# Altium integrated library Design III Symbols.IntLib: 69 symbols
Pins are listed as number, name and electrical type; pins without a type are passive.

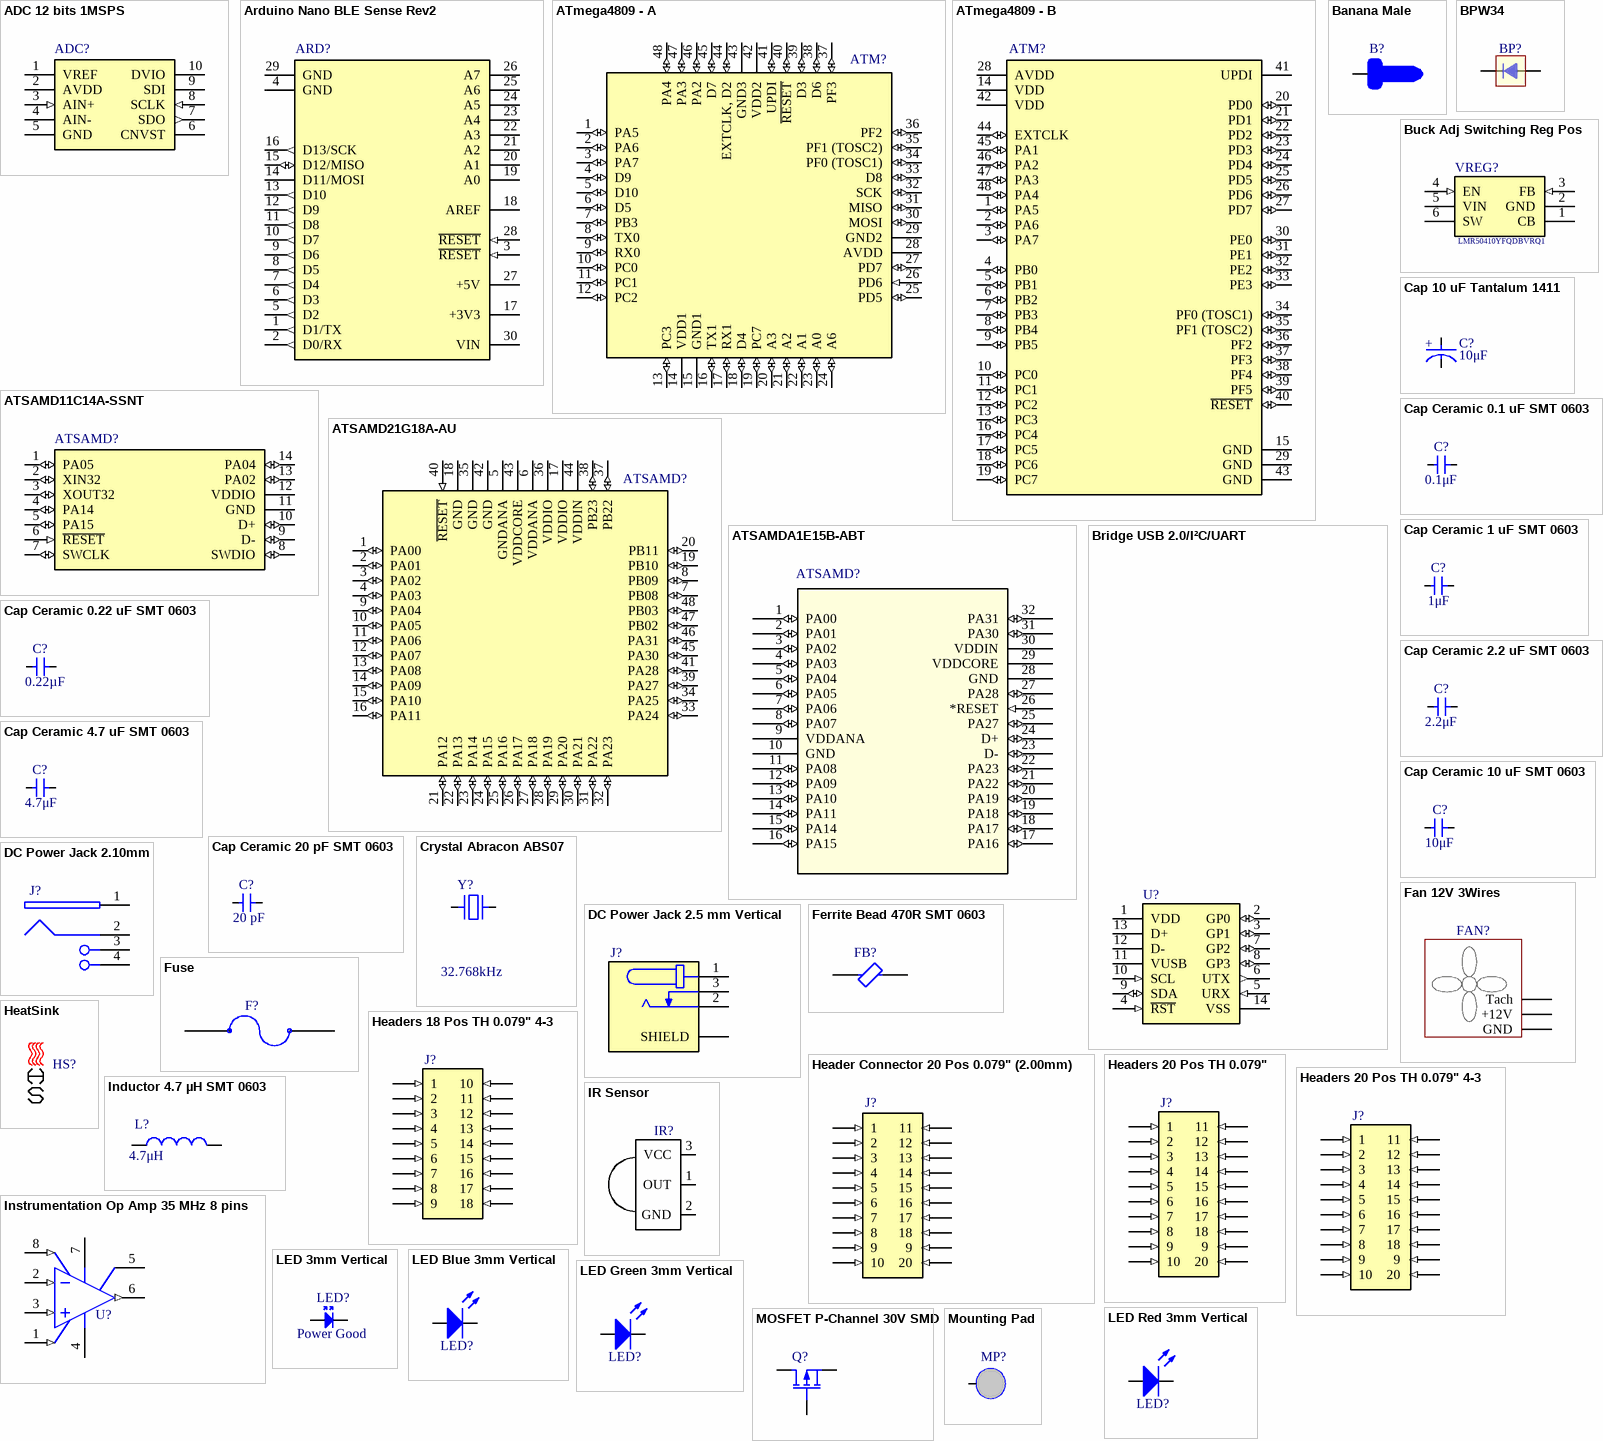
[diagram p0: symbols ADC 12 bits 1MSPS to Mounting Pad]

## ADC 12 bits 1MSPS
designator ADC?, comment MCP33141-10-E/MS  (value not drawn)
12 Bit Analog to Digital Converter 1 Input 1 SAR 10-MSOP; Supplier 1: Digi-Key; Supplier Part Number 1: MCP33141-10-E/MS-ND
footprint MCP33141-10-E/MS (12 Bit Analog to Digital Converter 1 Input 1 SAR 10-MSOP)
pins: 1 VREF (power), 2 AVDD (power), 3 AIN+ (in), 4 AIN-, 5 GND (power), 6 CNVST, 7 SDO (out), 8 SCLK (in), 9 SDI, 10 DVIO (power)

## Arduino Nano BLE Sense Rev2
designator ARD?
ABX00069, nRF52840 64MHz, 256 KB SRAM, 1MB flash, 14 I/O pins, 8 Analog inputs; Supplier 1: Digi-Key; Supplier Part Number 1: 1050-ABX00069-ND; ComponentLink1Description: Datasheet; ComponentLink1URL: https://docs.arduino.cc/static/65becb67a4b40fb616bb6af2730da4c7/ABX00069-datasheet.pdf; ComponentLink2Description: Pinout; ComponentLink2URL: https://docs.arduino.cc/static/9954a74bd83e85753daa710cb3e36c7d/ABX00069-full-pinout.pdf; ComponentLink3Description: Schematics; ComponentLink3URL: https://docs.arduino.cc/static/e36f3575dfede10661305c9971c3e7ed/ABX00069-schematics.pdf
footprint Arduino Nano BLE Sense Rev2 A (ABX00069, nRF52840 64MHz, 256 KB SRAM, 1MB flash, 14 I/O pins, 8 Analog inputs)
footprint Arduino Nano BLE Sense Rev2 B (ABX00069, nRF52840 64MHz, 256 KB SRAM, 1MB flash, 14 I/O pins, 8 Analog inputs)
pins: 1 D1/TX (out), 2 D0/RX (out), 3 ~{RESET} (in), 4 GND (power), 5 D2 (out), 6 D3 (out), 7 D4 (out), 8 D5 (out), 9 D6 (out), 10 D7 (out), 11 D8 (out), 12 D9 (out), 13 D10 (out), 14 D11/MOSI (hiz), 15 D12/MISO (io), 16 D13/SCK (out), 17 +3V3 (power), 18 AREF, 19 A0 (hiz), 20 A1 (hiz), 21 A2 (hiz), 22 A3 (hiz), 23 A4 (hiz), 24 A5 (hiz), 25 A6 (hiz), 26 A7 (hiz), 27 +5V (power), 28 ~{RESET} (in), 29 GND (power), 30 VIN (power)

## ATmega4809 - A
designator ATM?, comment ATMEGA4809-AU  (value not drawn)
AVR megaAVR® 0, Functional Safety (FuSa) Microcontroller IC 8-Bit 20MHz 48KB (24K x 16) FLASH 48-TQFP (7x7); Manufacturer_Name: Microchip; Manufacturer_Part_Number: ATMEGA4809-AFR; Geometry.Height: 1.2mm; Mouser Part Number: 556-ATMEGA4809-AFR; Mouser Price/Stock: https://www.mouser.co.uk/ProductDetail/Microchip-Technology-Atmel/ATMEGA4809-AFR?qs=lYGu3FyN48fyX8GjkvcD6Q%3D%3D; Arrow Part Number: ATMEGA4809-AFR; Arrow Price/Stock: https://www.arrow.com/en/products/atmega4809-afr/microchip-technology?region=nac; Datasheet Link: https://datasheet.datasheetarchive.com/originals/distributors/DKDS41/DSANUWW0026740.pdf; Supplier 1: Digi-Key; Supplier Part Number 1: ATMEGA4809-AFRCT-ND; Supplier 2: Digi-Key; Supplier Part Number 2: ATMEGA4809-AFRDKR-ND
footprint ATmega4809 (AVR megaAVR® 0, Functional Safety (FuSa) Microcontroller IC 8-Bit 20MHz 48KB (24K x 16) FLASH 48-TQFP (7x7))
pins: 1 PA5 (io), 2 PA6 (io), 3 PA7 (io), 4 D9 (io), 5 D10 (io), 6 D5 (io), 7 PB3 (io), 8 TX0 (io), 9 RX0 (io), 10 PC0 (io), 11 PC1 (io), 12 PC2 (io), 13 PC3 (io), 14 VDD1 (power), 15 GND1 (power), 16 TX1 (io), 17 RX1 (io), 18 D4 (io), 19 PC7 (io), 20 A3 (io), 21 A2 (io), 22 A1 (io), 23 A0 (io), 24 A6 (io), 25 PD5 (io), 26 PD6 (in), 27 PD7 (io), 28 AVDD (power), 29 GND2 (power), 30 MOSI (io), 31 MISO (io), 32 SCK (io), 33 D8 (io), 34 PF0 (TOSC1) (io), 35 PF1 (TOSC2) (io), 36 PF2 (io), 37 PF3 (io), 38 D6 (io), 39 D3 (io), 40 ~{RESET} (io), 41 UPDI (io), 42 VDD2 (power), 43 GND3 (power), 44 EXTCLK, D2 (io), 45 D7 (io), 46 PA2 (io), 47 PA3 (io), 48 PA4 (io)

## ATmega4809 - B
designator ATM?, comment ATMEGA4809-AU  (value not drawn)
MICROCHIP - ATMEGA4809-AFR - MCU, 8BIT, ATMEGA, 20MHZ, TQFP-48; Supplier 1: Digi-Key; Supplier Part Number 1: 150-ATMEGA4809-AU-ND; Supplier 2: Digi-Key; Supplier Part Number 2: 150-ATMEGA4809-AURCT-ND; Supplier 3: Digi-Key; Supplier Part Number 3: 150-ATMEGA4809-AURDKR-ND; Supplier 4: Digi-Key; Supplier Part Number 4: 150-ATMEGA4809-AURTR-ND
footprint ATmega4809 (AVR megaAVR® 0, Functional Safety (FuSa) Microcontroller IC 8-Bit 20MHz 48KB (24K x 16) FLASH 48-TQFP (7x7))
pins: 1 PA5 (io), 2 PA6 (io), 3 PA7 (io), 4 PB0 (io), 5 PB1 (io), 6 PB2 (io), 7 PB3 (io), 8 PB4 (io), 9 PB5 (io), 10 PC0 (io), 11 PC1 (io), 12 PC2 (io), 13 PC3 (io), 14 VDD (power), 15 GND (oe), 16 PC4 (io), 17 PC5 (io), 18 PC6 (io), 19 PC7 (io), 20 PD0 (io), 21 PD1 (io), 22 PD2 (io), 23 PD3 (io), 24 PD4 (io), 25 PD5 (io), 26 PD6 (io), 27 PD7 (io), 28 AVDD (power), 29 GND (power), 30 PE0 (io), 31 PE1 (io), 32 PE2 (io), 33 PE3 (io), 34 PF0 (TOSC1) (io), 35 PF1 (TOSC2) (io), 36 PF2 (io), 37 PF3 (io), 38 PF4 (io), 39 PF5 (io), 40 ~{RESET} (io), 41 UPDI, 42 VDD (power), 43 GND (power), 44 EXTCLK (io), 45 PA1 (io), 46 PA2 (io), 47 PA3 (io), 48 PA4 (io)

## ATSAMD11C14A-SSNT
designator ATSAMD?
ARM® Cortex®-M0+ SAM D11C Microcontroller IC 32-Bit Single-Core 48MHz 16KB (16K x 8) FLASH 14-SOIC; Supplier 1: Digi-Key; Supplier Part Number 1: ATSAMD11C14A-SSNTCT-ND; Supplier 2: Digi-Key; Supplier Part Number 2: ATSAMD11C14A-SSNTDKR-ND
footprint ATSAMD11C14A-SSNT (ARM® Cortex®-M0+ SAM D11C Microcontroller IC 32-Bit Single-Core 48MHz 16KB (16K x 8) FLASH 14-SOIC)
pins: 1 PA05 (io), 2 XIN32 (io), 3 XOUT32 (io), 4 PA14 (io), 5 PA15 (io), 6 ~{RESET} (in), 7 SWCLK (io), 8 SWDIO (io), 9 D- (io), 10 D+ (io), 11 GND (power), 12 VDDIO (power), 13 PA02 (io), 14 PA04 (io)

## ATSAMD21G18A-AU
designator ATSAMD?
ARM® Cortex®-M0+ SAM D21G, Functional Safety (FuSa) Microcontroller IC 32-Bit Single-Core 48MHz 256KB (256K x 8) FLASH 48-TQFP (7x7); Supplier 1: Digi-Key; Supplier Part Number 1: ATSAMD21G18A-AU-ND; ComponentLink1Description: Datasheet; ComponentLink1URL: https://ww1.microchip.com/downloads/en/DeviceDoc/SAM-D21-DA1-Family-Data-Sheet-DS40001882H.pdf; ComponentLink2Description: Arduino Zero; ComponentLink2URL: https://docs.arduino.cc/hardware/zero
footprint ATSAMD21G18-AU (ARM® Cortex®-M0+ SAM D21G, Functional Safety (FuSa) Microcontroller IC 32-Bit Single-Core 48MHz 256KB (256K x 8) FLASH 48-TQFP (7x7))
pins: 1 PA00 (io), 2 PA01 (io), 3 PA02 (io), 4 PA03 (io), 5 GNDANA (power) "Ground for the analog power domain", 6 VDDANA (power) "Analog supply voltage", 7 PB08 (io), 8 PB09 (io), 9 PA04 (io), 10 PA05 (io), 11 PA06 (io), 12 PA07 (io), 13 PA08 (io), 14 PA09 (io), 15 PA10 (io), 16 PA11 (io), 17 VDDIO (power) "Digital supply voltage", 18 GND (power) "Ground", 19 PB10 (io), 20 PB11 (io), 21 PA12 (io), 22 PA13 (io), 23 PA14 (io), 24 PA15 (io), 25 PA16 (io), 26 PA17 (io), 27 PA18 (io), 28 PA19 (io), 29 PA20 (io), 30 PA21 (io), 31 PA22 (io), 32 PA23 (io), 33 PA24 (io), 34 PA25 (io), 35 GND (power) "Ground", 36 VDDIO (power) "Digital supply voltage", 37 PB22 (io), 38 PB23 (io), 39 PA27 (io), 40 ~{RESET} (in) "Reset pin", 41 PA28 (io), 42 GND (power) "Ground", 43 VDDCORE (power) "Core supply voltage / external decoupling pin", 44 VDDIN (power), 45 PA30 (io), 46 PA31 (io), 47 PB02 (io), 48 PB03 (io)

## ATSAMDA1E15B-ABT
designator ATSAMD?
ARM® Cortex®-M0+ SAM DA1, Functional Safety (FuSa) Microcontroller IC 32-Bit Single-Core 48MHz 32KB (32K x 8) FLASH 32-TQFP (7x7); Supplier 1: Digi-Key; Supplier Part Number 1: ATSAMDA1E15B-ABTCT-ND; Supplier 2: Digi-Key; Supplier Part Number 2: ATSAMDA1E15B-ABTDKR-ND
footprint ATSAMDA1E15B-ABT
pins: 1 PA00 (io), 2 PA01 (io), 3 PA02 (io), 4 PA03 (io), 5 PA04 (io), 6 PA05 (io), 7 PA06 (io), 8 PA07 (io), 9 VDDANA (power), 10 GND (power), 11 PA08 (io), 12 PA09 (io), 13 PA10 (io), 14 PA11 (io), 15 PA14 (io), 16 PA15 (io), 17 PA16 (io), 18 PA17 (io), 19 PA18 (io), 20 PA19 (io), 21 PA22 (io), 22 PA23 (io), 23 D- (io), 24 D+ (io), 25 PA27 (io), 26 *RESET (in), 27 PA28 (io), 28 GND (power), 29 VDDCORE (power), 30 VDDIN (power), 31 PA30 (io), 32 PA31 (io)

## Banana Male
designator B?
footprint Banane Male (Johnson 108-0753-001)
pins: 1

## BPW34
designator BP?
Photodiode
footprint BPW34 (BPW34 Trough Hole)
pins: 1, 2

## Bridge USB 2.0/I²C/UART
designator U?, comment MCP2221A-I/SL  (value not drawn)
USB Bridge, USB to I²C/UART USB 2.0 I²C, UART Interface 14-SOIC; USB Standard: USB 2.0; Max Supply Voltage: 5.5V; Supplier 1: Digi-Key; Supplier Part Number 1: MCP2221A-I/SL-ND
footprint MCP2221A-I/SL (USB Bridge, USB to I²C/UART USB 2.0 I²C, UART Interface 14-SOIC)
pins: 1 VDD (power), 2 GP0 (io), 3 GP1 (io), 4 ~{RST} (in), 5 URX (in), 6 UTX (out), 7 GP2 (io), 8 GP3 (io), 9 SDA (io), 10 SCL (in), 11 VUSB (power), 12 D- (power), 13 D+ (power), 14 VSS (power)
text: /

## Buck Adj Switching Reg Pos
designator VREG?, comment LMR50410YFQDBVRQ1
Buck Switching Regulator IC Positive Adjustable 1V 1 Output 1A SOT-23-6; Manufacturer_Name: Texas Instruments; Datasheet Link: https://www.ti.com/product/LMR50410-Q1; Height: 1.45mm; Manufacturer_Part_Number: LMR50410YFQDBVRQ1; Mouser Part Number: 595-MR50410YFQDBVRQ1; Mouser Price/Stock: https://www.mouser.co.uk/ProductDetail/Texas-Instruments/LMR50410YFQDBVRQ1?qs=81r%252BiQLm7BRUAgUFqYZycA%3D%3D; Arrow Part Number: LMR50410YFQDBVRQ1; Arrow Price/Stock: https://www.arrow.com/en/products/lmr50410yfqdbvrq1/texas-instruments?region=nac; Supplier 1: Digi-Key; Supplier Part Number 1: 296-LMR50410YFQDBVRQ1CT-ND; Supplier 2: Digi-Key; Supplier Part Number 2: 296-LMR50410YFQDBVRQ1DKR-ND; Supplier 3: Digi-Key; Supplier Part Number 3: 296-LMR50410YFQDBVRQ1TR-ND
footprint LMR50410YFQDBVRQ1 (Buck Switching Regulator IC Positive Adjustable 1V 1 Output 1A SOT-23-6)
pins: 1 CB (power), 2 GND (power), 3 FB (in), 4 EN (in), 5 VIN (power), 6 SW (power)

## Cap 10 uF Tantalum 1411
designator C?, comment value 10μF  (hidden comment: 293D106X9016B2TE3)
10 µF Molded Tantalum Capacitors 16 V 1411 (3528 Metric) 2Ohm; Voltage Rating: 16V; Case Code (Imperial): 1411; Supplier 1: Digi-Key; Supplier Part Number 1: 718-1124-1-ND; Supplier 2: Digi-Key; Supplier Part Number 2: 718-1124-6-ND; Supplier 3: Digi-Key; Supplier Part Number 3: 718-1124-2-ND
footprint Cap Tantalum 10 uF 16V SMT 1411 (10 µF Molded Tantalum Capacitors 16 V 1411 (3528 Metric) 2Ohm)
pins: 1 C, 2 A
text: +

## Cap Ceramic 0.1 uF SMT 0603
designator C?, comment Capacitance: 0.1μF  (hidden comment: CC0603JRX7R9BB104)
0.1 µF ±5% 50V Ceramic Capacitor X7R 0603 (1608 Metric); manufacturer: Yageo; Part Number: CC0603JRX7R9BB104; Applications: General Purpose; componentlink1description: Datasheet; componentlink1url: https://www.yageo.com/upload/media/product/productsearch/datasheet/mlcc/UPY-GPHC_X7R_6.3V-to-50V_18.pdf; componentlink2description: DigiKey Link; componentlink2url: https://www.digikey.com/en/products/detail/yageo/CC0603JRX7R9BB104/5195188; Device Package: 0603 (1608 Metric); lastupdated: 2023-03-06 20:08:09; Lifecycle Status: Active; Minimum Order: 1; Mounting Type: Surface Mount, MLCC; Operating Temperature: -55°C ~ 125°C; Package / Case: 0603 (1608 Metric); packaging: TapeAndReel; partid: 12474; Part Status: Active; price: 0.01; series: CC; Size / Dimension: 0.063" L x 0.031" W (1.60mm x 0.80mm); Temperature Coefficient: X7R; Thickness (Max): 0.035" (0.90mm); Tolerance: ±5%; Voltage - Rated: 50V; Supplier 1: Digi-Key; Supplier Part Number 1: 311-1779-1-ND; Supplier 2: Digi-Key; Supplier Part Number 2: 311-1779-6-ND; Supplier 3: Digi-Key; Supplier Part Number 3: 311-1779-2-ND
footprint Cap Ceramic 0.1 uF 50V SMT 0603 (0.1 µF ±5% 50V Ceramic Capacitor X7R 0603 (1608 Metric))
pins: 1, 2

## Cap Ceramic 0.22 uF SMT 0603
designator C?, comment Capacitance: 0.22µF  (hidden comment: GRM188R71E224KA88D)
0.22 µF ±10% 25V Ceramic Capacitor X7R 0603 (1608 Metric); manufacturer: Murata Electronics; Part Number: GRM188R71E224KA88D; Applications: General Purpose; componentlink1description: Datasheet; componentlink1url: https://www.murata.com/~/media/webrenewal/support/library/catalog/products/capacitor/mlcc/c02e.ashx?la=en-us; componentlink2description: DigiKey Link; componentlink2url: https://www.digikey.com/en/products/detail/murata-electronics/GRM188R71E224KA88D/702554; Device Package: 0603 (1608 Metric); lastupdated: 2023-03-05 20:08:17; Lifecycle Status: Active; Minimum Order: 1; Mounting Type: Surface Mount, MLCC; Operating Temperature: -55°C ~ 125°C; Package / Case: 0603 (1608 Metric); packaging: TapeAndReel; partid: 11196; Part Status: Active; price: 0.01; series: GRM; Size / Dimension: 0.063" L x 0.031" W (1.60mm x 0.80mm); Temperature Coefficient: X7R; Thickness (Max): 0.035" (0.90mm); Tolerance: ±10%; Voltage - Rated: 25V; Supplier 1: Digi-Key; Supplier Part Number 1: 490-3290-1-ND; Supplier 2: Digi-Key; Supplier Part Number 2: 490-3290-6-ND; Supplier 3: Digi-Key; Supplier Part Number 3: 490-3290-2-ND
footprint Cap Ceramic 0.22 uF 25V SMT 0603 (0.22 µF ±10% 25V Ceramic Capacitor X7R 0603 (1608 Metric))
pins: 1, 2

## Cap Ceramic 1 uF SMT 0603
designator C?, comment value 1μF  (hidden comment: CC0603KPX7R7BB105)
1 µF ±10% 16V Ceramic Capacitor X7R 0603 (1608 Metric); Dielectric: XR7; Tolerance: 10%; Max Operating Temperature: 125°C; Case Code (Imperial): 0603; Voltage Rating (DC): 16V; Resistor Type: Ceramic; Height: 0.8mm; Length: 1.6mm; Construction: Flat; Termination: SMT/SMD; Min Operating Temperature: -55°C; Supplier 1: Digi-Key; Supplier Part Number 1: 13-CC0603KPX7R7BB105CT-ND; Supplier 2: Digi-Key; Supplier Part Number 2: 13-CC0603KPX7R7BB105DKR-ND; Supplier 3: Digi-Key; Supplier Part Number 3: 13-CC0603KPX7R7BB105TR-ND
footprint Cap Ceramic 1 uF 16V SMT 0603 (1 µF ±10% 16V Ceramic Capacitor X5R 0603 (1608 Metric))
pins: 1, 2

## Cap Ceramic 2.2 uF SMT 0603
designator C?, comment value 2.2μF  (hidden comment: CC0603KRX7R5BB225)
2.2 µF ±10% 6.3V Ceramic Capacitor X7R 0603 (1608 Metric); manufacturer: Yageo; Part Number: CC0603KRX7R5BB225; Applications: General Purpose; componentlink1description: Datasheet; componentlink1url: https://www.yageo.com/upload/media/product/productsearch/datasheet/mlcc/UPY-GPHC_X7R_6.3V-to-50V_18.pdf; componentlink2description: DigiKey Link; componentlink2url: https://www.digikey.com/en/products/detail/yageo/CC0603KRX7R5BB225/5195203; Device Package: 0603 (1608 Metric); lastupdated: 2023-03-06 20:08:32; Lifecycle Status: Active; Minimum Order: 1; Mounting Type: Surface Mount, MLCC; Operating Temperature: -55°C ~ 125°C; Package / Case: 0603 (1608 Metric); packaging: TapeAndReel; partid: 41539; Part Status: Active; price: 0.01; series: CC; Size / Dimension: 0.063" L x 0.031" W (1.60mm x 0.80mm); Temperature Coefficient: X7R; Thickness (Max): 0.035" (0.90mm); Tolerance: ±10%; Voltage - Rated: 6.3V; ComponentLink1Description: Datasheet; ComponentLink1URL: *; Supplier 1: Digi-Key; Supplier Part Number 1: 311-1795-1-ND; Supplier 2: Digi-Key; Supplier Part Number 2: 311-1795-6-ND; Supplier 3: Digi-Key; Supplier Part Number 3: 311-1795-2-ND
footprint Cap Ceramic 2.2 uF 6.3V SMT 0603 (2.2 µF ±10% 6.3V Ceramic Capacitor X7R 0603 (1608 Metric))
pins: 1, 2

## Cap Ceramic 4.7 uF SMT 0603
designator C?, comment Capacitance: 4.7μF  (hidden comment: CC0603KRX5R7BB475)
4.7 µF ±10% 16V Ceramic Capacitor X5R 0603 (1608 Metric); manufacturer: Yageo; Part Number: CC0603KRX5R7BB475; Applications: General Purpose; componentlink1description: Datasheet; componentlink1url: https://www.yageo.com/upload/media/product/productsearch/datasheet/mlcc/UPY-GPHC_X5R_4V-to-50V_25.pdf; componentlink2description: DigiKey Link; componentlink2url: https://www.digikey.com/en/products/detail/yageo/CC0603KRX5R7BB475/5195193; Device Package: 0603 (1608 Metric); lastupdated: 2023-03-06 20:07:35; Lifecycle Status: Active; Minimum Order: 1; Mounting Type: Surface Mount, MLCC; Operating Temperature: -55°C ~ 85°C; Package / Case: 0603 (1608 Metric); packaging: TapeAndReel; partid: 46011; Part Status: Active; price: 0.02; series: CC; Size / Dimension: 0.063" L x 0.031" W (1.60mm x 0.80mm); Temperature Coefficient: X5R; Thickness (Max): 0.037" (0.95mm); Tolerance: ±10%; Voltage - Rated: 16V; Supplier 1: Digi-Key; Supplier Part Number 1: 311-1785-1-ND; Supplier 2: Digi-Key; Supplier Part Number 2: 311-1785-6-ND; Supplier 3: Digi-Key; Supplier Part Number 3: 311-1785-2-ND
footprint Cap Ceramic 4.7 uF SMT 0603 (4.7 µF ±10% 16V Ceramic Capacitor X5R 0603 (1608 Metric))
pins: 1, 2

## Cap Ceramic 10 uF SMT 0603
designator C?, comment Capacitance: 10μF  (hidden comment: GRM188R60J106KE47J)
10 µF ±10% 6.3V Ceramic Capacitor X5R 0603 (1608 Metric); manufacturer: Murata Electronics; Part Number: GRM188R60J106KE47J; Applications: General Purpose; componentlink2description: DigiKey Link; componentlink2url: https://www.digikey.com/en/products/detail/murata-electronics/GRM188R60J106KE47J/10691412; Device Package: 0603 (1608 Metric); lastupdated: 2023-03-08 20:07:22; Lifecycle Status: Active; Minimum Order: 1; Mounting Type: Surface Mount, MLCC; Operating Temperature: -55°C ~ 85°C; Package / Case: 0603 (1608 Metric); packaging: TapeAndReel; partid: 47219; Part Status: Active; price: 0.01; series: GRM; Size / Dimension: 0.063" L x 0.032" W (1.60mm x 0.80mm); Temperature Coefficient: X5R; Thickness (Max): 0.035" (0.90mm); Tolerance: ±10%; Voltage - Rated: 6.3V; Supplier 1: Digi-Key; Supplier Part Number 1: 490-GRM188R60J106KE47JCT-ND; Supplier 2: Digi-Key; Supplier Part Number 2: 490-GRM188R60J106KE47JDKR-ND; Supplier 3: Digi-Key; Supplier Part Number 3: 490-GRM188R60J106KE47JTR-ND
footprint Cap Ceramic 10 uF SMT 0603 (10 µF ±10% 6.3V Ceramic Capacitor X5R 0603 (1608 Metric))
pins: 1, 2

## Cap Ceramic 20 pF SMT 0603
designator C?, comment Capacitance: 20 pF  (hidden comment: CC0603JRNPO9BN200)
20 pF ±5% 50V Ceramic Capacitor C0G, NP0 0603 (1608 Metric); manufacturer: Yageo; Part Number: CC0603JRNPO9BN200; Applications: General Purpose; componentlink1description: Datasheet; componentlink1url: https://www.yageo.com/upload/media/product/productsearch/datasheet/mlcc/UPY-GP_NP0_16V-to-50V_17.pdf; componentlink2description: DigiKey Link; componentlink2url: https://www.digikey.com/en/products/detail/yageo/CC0603JRNPO9BN200/2833589; Device Package: 0603 (1608 Metric); lastupdated: 2023-03-06 20:07:50; Lifecycle Status: Active; Minimum Order: 1; Mounting Type: Surface Mount, MLCC; Operating Temperature: -55°C ~ 125°C; Package / Case: 0603 (1608 Metric); packaging: TapeAndReel; partid: 16728; Part Status: Active; price: 0.01; series: CC; Size / Dimension: 0.063" L x 0.031" W (1.60mm x 0.80mm); Temperature Coefficient: C0G, NP0; Thickness (Max): 0.035" (0.90mm); Tolerance: ±5%; Voltage - Rated: 50V; Supplier 1: Digi-Key; Supplier Part Number 1: 311-1424-1-ND; Supplier 2: Digi-Key; Supplier Part Number 2: 311-1424-6-ND; Supplier 3: Digi-Key; Supplier Part Number 3: 311-1424-2-ND
footprint Capacitor 20 pF SMT 0603
pins: 1, 2

## Crystal Abracon ABS07
designator Y?, comment value 32.768kHz  (hidden comment: ABS07-120-32.768KHZ-T)
32.768 kHz ±20ppm Crystal 6pF 55 kOhms 2-SMD, No Lead; Manufacturer: Abracon LLC; Operating Mode: Fundamental; Part Number: ABS07-120-32.768KHZ-T; ComponentLink1Description: Datasheet; ComponentLink1URL: https://abracon.com/Resonators/ABS07-120-32.768kHz-T.pdf; ComponentLink2Description: DigiKey Link; ComponentLink2URL: https://www.digikey.com/en/products/detail/abracon-llc/ABS07-120-32-768KHZ-T/3724043; ESR (Equivalent Series Resistance): 55 kOhms; Frequency Tolerance: ±20ppm; Height - Seated (Max): 0.035" (0.90mm); LastUpdated: 2023-03-06 20:57:22; Lifecycle Status: Active; Load Capacitance: 6pF; Minimum Order: 1; Mounting Type: Surface Mount; Operating Temperature: -40°C ~ 85°C; Package / Case: 2-SMD, No Lead; Packaging: TapeAndReel; PartId: 385; Part Status: Active; Price: 0.44; Series: ABS07; Size / Dimension: 0.126" L x 0.059" W (3.20mm x 1.50mm); Type: kHz Crystal (Tuning Fork); Supplier 1: Digi-Key; Supplier Part Number 1: 535-11937-1-ND; Supplier 2: Digi-Key; Supplier Part Number 2: 535-11937-6-ND; Supplier 3: Digi-Key; Supplier Part Number 3: 535-11937-2-ND; Frequency: 32.768 kHz
footprint ABS07-120-32.768KHZ-T A (32.768 kHz ±20ppm Crystal 6pF 55 kOhms 2-SMD, No Lead)
footprint ABS07-120-32.768KHZ-T B (32.768 kHz ±20ppm Crystal 6pF 55 kOhms 2-SMD, No Lead)
pins: 1, 2

## DC Power Jack 2.5 mm Vertical
designator J?, comment PJ-090BH  (value not drawn)
Power Barrel Connector Jack 2.50mm ID (0.098"), 5.50mm OD (0.217") Through Hole; Shielding: Shielded; Voltage Rating: 25V; Current Rating: 5A; Supplier 1: Digi-Key; Supplier Part Number 1: 102-5562-1-ND; Supplier 2: Digi-Key; Supplier Part Number 2: 102-5562-2-ND; Min Operating Temperature: -25°C; Max Operating Temperature: 85°C; Contact Material - Plating: Silver; Housing Material: Polyamide (PA10T), Nylon 10T; Contact Material: Brass, Copper Alloy
footprint DC Power Jack 2.5 mm (Power Barrel Connector Jack 2.50mm ID (0.098"), 5.50mm OD (0.217") Through Hole)
pins: 1, 2, 3, S1 SHIELD

## DC Power Jack 2.10mm
designator J?, comment PJ-063AH  (value not drawn)
Power Barrel Connector Jack 2.10mm ID (0.083"), 5.50mm OD (0.217") Through Hole, Right Angle; Current Rating: 8A; Shielding: Shielded; Voltage Rating: 24V; Insulation Resistance: 100MR; Number of Conductors: 2; Supplier 1: Digi-Key; Supplier Part Number 1: CP-063AH-ND; ComponentLink1Description: Datasheet; ComponentLink1URL: https://www.cuidevices.com/product/resource/pj-063ah.pdf; Max Operating Temperature: 85°C; Min Operating Temperature: -25°C; Contact Material: Copper; Contact Plating: Nickel; Flammability Rating: UL94 V-0
footprint DC Power Jack 2.1mm (PJ-063AH)
pins: 1, 2, 3 SHLD, 4 SHLD

## Fan 12V 3Wires
designator FAN?  (value not drawn)
footprint FAN 12V 3 WIRES + HS
pins: 1 GND (power), 2 +12V (power), 3 Tach

## Ferrite Bead 470R SMT 0603
designator FB?, comment BLM18PG471SN1D  (value not drawn)
470 Ω @ 100 MHz 1 Power Line Ferrite Bead 0603 (1608 Metric) 1A 200mOhm; Manufacturer: Murata Electronics; Impedance @ Frequency: 470 Ohms @ 100 MHz; Number of Lines: 1; Part Number: BLM18PG471SN1D; ComponentLink1Description: Datasheet; ComponentLink1URL: https://www.murata.com/en-us/products/productdata/8796738650142/ENFA0003.pdf; ComponentLink2Description: DigiKey Link; ComponentLink2URL: https://www.digikey.com/en/products/detail/murata-electronics/BLM18PG471SN1D/1948328; Current Rating (Max): 1A; DC Resistance (DCR) (Max): 200mOhm; Device Package: 0603 (1608 Metric); Filter Type: Power Line; Height (Max): 0.037" (0.95mm); LastUpdated: 2023-03-06 20:49:55; Lifecycle Status: Active; Minimum Order: 1; Mounting Type: Surface Mount; Operating Temperature: -55°C ~ 125°C; Package / Case: 0603 (1608 Metric); Packaging: TapeAndReel; PartId: 856; Part Status: Active; Price: 0.02; Series: EMIFIL®, BLM18; Size / Dimension: 0.063" L x 0.032" W (1.60mm x 0.80mm); Value: 470 Ω @ 100 MHz; Supplier 1: Digi-Key; Supplier Part Number 1: 490-5223-1-ND; Supplier 2: Digi-Key; Supplier Part Number 2: 490-5223-6-ND; Supplier 3: Digi-Key; Supplier Part Number 3: 490-5223-2-ND
footprint Ferrite Bead 470R SMT 0603 (470 Ohms @ 100 MHz 1 Power Line Ferrite Bead 0603 (1608 Metric) 1A 200mOhm)
pins: 1, 2

## Fuse
designator F?
Fuse
footprint Fuse Holder 3mm
pins: 1, 2

## Header Connector 20 Pos 0.079" (2.00mm)
designator J?, comment NPPN102AFCN-RC  (value not drawn)
20 Position Header Connector 0.079" (2.00mm) Through Hole Gold; Supplier 1: Digi-Key; Supplier Part Number 1: S5750-10-ND
footprint Header Connector 20 Pos 0.079" (2.00mm) - A (20 Position Header Connector 0.079" (2.00mm) Through Hole Gold)
footprint Header Connector 20 Pos 0.079" (2.00mm) - B
pins: 1 (in), 2 (in), 3 (in), 4 (in), 5 (in), 6 (in), 7 (in), 8 (in), 9 (in), 10 (in), 11 (in), 12 (in), 13 (in), 14 (in), 15 (in), 16 (in), 17 (in), 18 (in), 19 9 (in), 20 (in)

## Headers 18 Pos TH 0.079" 4-3
designator J?, comment BF050-18-A-B-0400-0300-L-G  (value not drawn)
Connector Header Through Hole 18 position 0.079" (2.00mm); Supplier 1: Digi-Key; Supplier Part Number 1: 2073-BF050-18-A-B-0400-0300-L-G-ND
footprint Headers 20 Pos TH 0.079" A (Connector Header Through Hole 20 position 0.079" (2.00mm))
footprint Headers 20 Pos TH 0.079" B (Connector Header Through Hole 20 position 0.079" (2.00mm))
pins: 1 (in), 2 (in), 3 (in), 4 (in), 5 (in), 6 (in), 7 (in), 8 (in), 9 (in), 10 (in), 11 (in), 12 (in), 13 (in), 14 (in), 15 (in), 16 (in), 17 (in), 18 (in)

## Headers 20 Pos TH 0.079"
designator J?, comment BF050-20-A-B-0600-0300-L-G  (value not drawn)
Connector Header Through Hole 20 position 0.079" (2.00mm); Supplier 1: Digi-Key; Supplier Part Number 1: 2073-BF050-20-A-B-0600-0300-L-G-ND
footprint Headers 20 Pos TH 0.079" A (Connector Header Through Hole 20 position 0.079" (2.00mm))
footprint Headers 20 Pos TH 0.079" B (Connector Header Through Hole 20 position 0.079" (2.00mm))
pins: 1 (in), 2 (in), 3 (in), 4 (in), 5 (in), 6 (in), 7 (in), 8 (in), 9 (in), 10 (in), 11 (in), 12 (in), 13 (in), 14 (in), 15 (in), 16 (in), 17 (in), 18 (in), 19 9 (in), 20 (in)

## Headers 20 Pos TH 0.079" 4-3
designator J?, comment BF050-20-A-B-0400-0300-L-G  (value not drawn)
Connector Header Through Hole 20 position 0.079" (2.00mm); Supplier 1: Digi-Key; Supplier Part Number 1: 2073-BF050-20-A-B-0400-0300-L-G-ND
footprint Headers 20 Pos TH 0.079" 4-3 - A (Connector Header Through Hole 20 position 0.079" (2.00mm))
footprint Headers 20 Pos TH 0.079" 4-3 - B (Connector Header Through Hole 20 position 0.079" (2.00mm))
pins: 1 (in), 2 (in), 3 (in), 4 (in), 5 (in), 6 (in), 7 (in), 8 (in), 9 (in), 10 (in), 11 (in), 12 (in), 13 (in), 14 (in), 15 (in), 16 (in), 17 (in), 18 (in), 19 9 (in), 20 (in)

## HeatSink
designator HS?  (value not drawn)
footprint FAN 12V 3 WIRES + HS
footprint HeatSink V8511W Assmann
